# Altium footprint library Semiconductor.PcbLib: 73 footprints (part 3 of 5)
Each footprint in its own frame and in the unit in brackets; x right, y up, seen from the top. Pads: shape width x height; smd on the part's side, far side on the other; paste and mask are expansions set on the pad; w line width, h text height; cw(c..) or ccw(c..) is an arc to the next point about the centre after c.
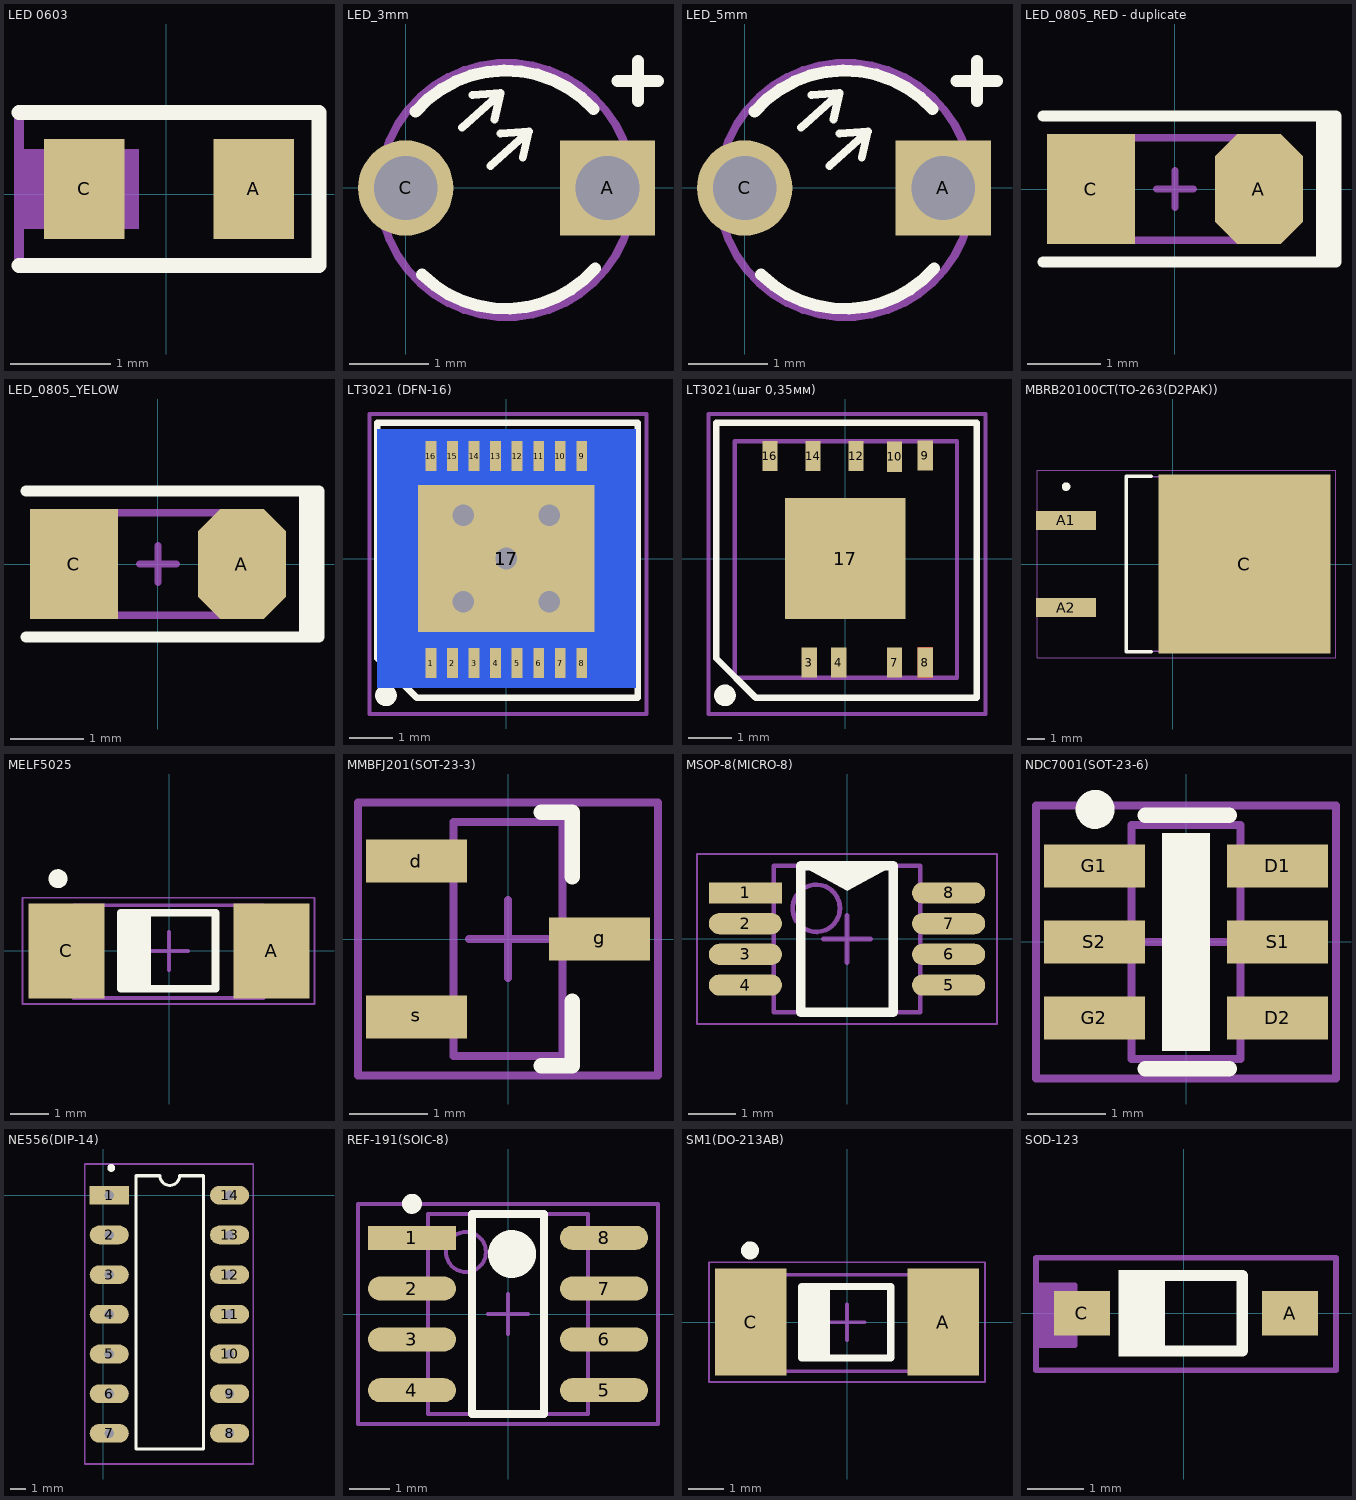
[diagram p2: the footprints below, top view; thin cyan lines are the x and y axes]

## LED 0603 [mm] "LED 0603"
height 0.5
pads (2):
  rect 0.8x1 smd: A(0.872,0.051) C(-0.821,0.051)
Top Overlay:
  lines w0.15: -1.473,-0.711 1.524,-0.711 1.524,0.813 -1.473,0.813
Mechanical 29:
  rectangle: -1.473,-0.349 -0.273,0.451
  lines w0.1: -1.473,-0.711 1.524,-0.711 1.524,0.813 -1.473,0.813 -1.473,-0.711
  text ".Designator" at -0.914,-0.127 h1
3D body: height 0.6, standoff 0, extent -0.81,-0.343 0.81,0.457

## LED_3mm [mm]
pads (2):
  rect 1.2x1.2 hole 0.8: A(2.54,0)
  round 1.2 hole 0.8: C(0,0)
Top Overlay:
  lines w0.1: 0.711,0.762 1.194,1.194 ; 1.067,0.279 1.549,0.711 ; 1.118,0.864 1.194,1.194 ; 1.473,0.381 1.549,0.711 ; 1.194,1.194 0.838,1.168 1.194,1.194 ; 1.549,0.711 1.194,0.686 1.549,0.711
  lines w0.15: 0.125,0.962 cw(c1.258,-0.02) 2.365,0.991 ; 0.206,-1.089 ccw(c1.258,-0.02) 2.386,-1.009 ; 2.667,1.346 3.175,1.346 ; 2.921,1.092 2.921,1.6
Mechanical 15:
  circle w0.1: c1.27,-0.025 r1.6
3D body: height 5.51, standoff -2.49, extent -0.404,-1.626 2.896,1.663

## LED_5mm [mm]
pads (2):
  rect 1.2x1.2 hole 0.8: A(2.5,0)
  round 1.2 hole 0.8: C(0,0)
Top Overlay:
  lines w0.1: 0.711,0.762 1.194,1.194 ; 1.067,0.279 1.549,0.711 ; 1.118,0.864 1.194,1.194 ; 1.473,0.381 1.549,0.711 ; 1.194,1.194 0.838,1.168 1.194,1.194 ; 1.549,0.711 1.194,0.686 1.549,0.711
  lines w0.15: 0.125,0.962 cw(c1.258,-0.02) 2.365,0.991 ; 0.206,-1.089 ccw(c1.258,-0.02) 2.386,-1.009 ; 2.667,1.346 3.175,1.346 ; 2.921,1.092 2.921,1.6
Mechanical 15:
  circle w0.1: c1.27,-0.025 r1.6
3D body: height 12.6, standoff -3, extent -1.65,-2.9 4.25,3

## LED_0805_RED - duplicate [mm] "Chip Resistor, 2-Leads, Body 2,0x1,3mm, IPC Medium Density"
height 0.5
pads (2):
  oct 1.2x1.5 smd: A(1.148,0)
  rect 1.2x1.5 smd: C(-1.148,0)
Top Overlay:
  lines w0.15: -1.8,-1 2.2,-1 2.2,1 -1.8,1 ; 2,-1 2,1 ; 2.1,-1 2.1,1
Mechanical 13:
  lines w0.1: -1.05,-0.7 -1.05,0.7 1.05,0.7 1.05,-0.7 -1.05,-0.7
Mechanical 15:
  lines w0.1: -0.25,0 0.25,0 ; 0,-0.25 0,0.25
3D body: height 1.1, standoff 0, extent -1.045,-0.62 0.975,0.63

## LED_0805_YELOW [mm] "Chip Resistor, 2-Leads, Body 2,0x1,3mm, IPC Medium Density"
height 0.5
pads (2):
  oct 1.2x1.5 smd: A(1.148,0)
  rect 1.2x1.5 smd: C(-1.148,0)
Top Overlay:
  lines w0.15: -1.8,-1 2.2,-1 2.2,1 -1.8,1 ; 2,-1 2,1 ; 2.1,-1 2.1,1
Mechanical 13:
  lines w0.1: -1.05,-0.7 -1.05,0.7 1.05,0.7 1.05,-0.7 -1.05,-0.7
Mechanical 15:
  lines w0.1: -0.25,0 0.25,0 ; 0,-0.25 0,0.25
3D body: height 1.1, standoff 0, extent -1.045,-0.62 0.975,0.63

## LT3021 (DFN-16) [mm] "QFN, 16-Leads, Body 5,1x5,1mm (max), Pitch 0,50mm, IPC Medium Density"
height 0.8
pads (18):
  rect 0.25x0.7 smd: 1(-1.75,-2.425) 2(-1.25,-2.425) 3(-0.75,-2.425) 4(-0.25,-2.425) 5(0.25,-2.425) 6(0.75,-2.425) 7(1.25,-2.425) 8(1.75,-2.425) 9(1.75,2.375) 10(1.25,2.375) 11(0.75,2.375) 12(0.25,2.375) 13(-0.25,2.375) 14(-0.75,2.375) 15(-1.25,2.375) 16(-1.75,2.375)
  rect 4.1x3.4 smd: 17(0,0)
  rect 6x6 smd far side: 17(0,0)
via -1,1 diameter 0.9 hole 0.5
via 1,1 diameter 0.9 hole 0.5
via -1,-1 diameter 0.9 hole 0.5
via 1,-1 diameter 0.9 hole 0.5
via 0,0 diameter 0.9 hole 0.5
Top Overlay:
  circle w0.25: c-2.792,-3.175 r0.125
  lines w0.15: -2.997,-2.311 -2.083,-3.226 3.048,-3.226 3.048,3.15 -2.997,3.15 -2.997,-2.311
Mechanical 13:
  lines w0.1: -2.565,-2.769 -2.565,2.718 2.591,2.718 2.591,-2.769 -2.565,-2.769
Mechanical 15:
  lines w0.1: -3.175,-3.607 -3.175,3.353 3.251,3.353 3.251,-3.607 -3.175,-3.607
3D body: height 0.75, standoff -0.05, extent -2.565,-2.769 2.535,2.731

## LT3021(шаг 0,35мм) [mm] "QFN, 16-Leads, Body 5,1x5,1mm (max), Pitch 0,50mm, IPC Medium Density"
height 0.8
pads (10):
  rect 0.35x0.7 smd: 3(-0.838,-2.413) 4(-0.152,-2.413) 7(1.143,-2.413) 8(1.854,-2.413) 9(1.854,2.388) 10(1.143,2.362) 12(0.25,2.375) 14(-0.75,2.375) 16(-1.75,2.375)
  rect 2.8x2.8 smd: 17(0,0)
Top Layer:
  rectangle: 1.676,-2.769 2.032,-2.057
Top Overlay:
  circle w0.25: c-2.792,-3.175 r0.125
  lines w0.15: -2.997,-2.311 -2.083,-3.226 3.048,-3.226 3.048,3.15 -2.997,3.15 -2.997,-2.311
Top Solder:
  rectangle: 0.864,1.905 2.134,2.845
  rectangle: 1.397,-2.87 1.6,-1.956
  rectangle: -0.584,-2.87 -0.406,-1.956
Mechanical 13:
  lines w0.1: -2.565,-2.769 -2.565,2.718 2.591,2.718 2.591,-2.769 -2.565,-2.769
Mechanical 15:
  lines w0.1: -3.175,-3.607 -3.175,3.353 3.251,3.353 3.251,-3.607 -3.175,-3.607
3D body: height 0.75, standoff -0.05, extent -2.565,-2.769 2.535,2.731

## MBRB20100CT(TO-263(D2PAK)) [mm] "D2-PAK, 6-Pads, Body 7,42x8,44mm (max), IPC Medium Density"
height 4.65
pads (3):
  rect 3.5x1.1 smd: A1(-6.2,2.54) A2(-6.2,-2.54)
  rect 10x10.4 smd: C(4.17,0)
Top Overlay:
  circle w0.25: c-6.2,4.5 r0.125
  lines w0.2: -1.25,-5.1 -2.7,-5.1 -2.7,5.1 -1.25,5.1
Mechanical 13:
  lines w0.1: -2.7,-5.075 5.94,-5.075 5.94,5.075 -2.7,5.075 -2.7,-5.075
Mechanical 15:
  lines w0.05: -7.875,-5.45 9.5,-5.45 9.5,5.45 -7.875,5.45 -7.875,-5.45
  lines w0.1: -0.5,0 0.5,0 ; 0,-0.5 0,0.5
3D body: height 4.88, standoff 0.08, extent -7.53,-5 8.14,5

## MELF5025 [mm]
pads (2):
  rect 2x2.5 smd: A(2.7,0) C(-2.7,0)
Top Overlay:
  circle w0.25: c-2.925,1.9 r0.125
  rectangle: -1.275,-1 -0.475,1
  lines w0.2: -1.275,-1 1.225,-1 1.225,1 -1.275,1 -1.275,-1
Mechanical 13:
  lines w0.1: -2.515,-1.245 -2.515,1.2 2.489,1.2 2.489,-1.245 -2.515,-1.245
Mechanical 15:
  lines w0.05: -3.861,-1.4 3.835,-1.4 3.835,1.4 -3.861,1.4 -3.861,-1.4
  lines w0.1: -0.5,0 0.5,0 ; 0,-0.5 0,0.5
3D body: height 2.55, standoff 0.05, extent -2.5,-1.25 2.5,1.25

## MMBFJ201(SOT-23-3) [mm] "SOT23, 3-Leads, Body 3,0x2,6mm (max), Pitch 0,95mm, IPC Medium Density"
height 1.1
pads (3):
  rect 1.3x0.55 smd: d(-1.175,1.001) g(1.175,0) s(-1.175,-1.001)
Top Overlay:
  lines w0.2: 0.425,-1.625 0.825,-1.625 0.825,-0.8 ; 0.425,1.625 0.825,1.625 0.825,0.8
Mechanical 13:
  lines w0.1: -0.7,-1.5 0.7,-1.5 0.7,1.5 -0.7,1.5 -0.7,-1.5
Mechanical 15:
  lines w0.1: -0.5,0 0.5,0 ; 0,-0.5 0,0.5 ; -1.925,-1.75 1.925,-1.75 1.925,1.75 -1.925,1.75 -1.925,-1.75
3D body: height 1.1, standoff 0, extent -1.271,-1.5 1.271,1.5

## MSOP-8(MICRO-8) [mm] "TSOP, 8-Leads, Body 3,00x3,00mm, Pitch 0,65mm, IPC Medium Density"
height 1.11
pads (8):
  rect 1.55x0.45 smd: 1(-2.15,0.975)
  oval 1.55x0.45 smd: 2(-2.15,0.325) 3(-2.15,-0.325) 4(-2.15,-0.975) 5(2.15,-0.975) 6(2.15,-0.325) 7(2.15,0.325) 8(2.15,0.975)
Top Overlay:
  region: -0.965,1.55 0.975,1.55 0,1.016
  lines w0.2: -0.975,-1.55 0.975,-1.55 0.975,1.55 -0.975,1.55 -0.975,-1.55
Mechanical 13:
  circle w0.1: c-0.65,0.65 r0.5
  lines w0.1: -1.55,-1.55 1.55,-1.55 1.55,1.55 -1.55,1.55 -1.55,-1.55
Mechanical 15:
  lines w0.05: -3.175,-1.8 3.175,-1.8 3.175,1.8 -3.175,1.8 -3.175,-1.8
  lines w0.1: -0.5,0 0.5,0 ; 0,-0.5 0,0.5
3D body: height 0.92, standoff 0, extent -2.5,-1.5 2.5,1.5

## NDC7001(SOT-23-6) [mm]
height 1.1
pads (6):
  rect 1.3x0.55 smd: D1(1.175,0.975) D2(1.175,-0.975) G1(-1.175,0.975) G2(-1.175,-0.975) S1(1.175,0) S2(-1.175,0)
Top Overlay:
  circle w0.25: c-1.166,1.702 r0.125
  rectangle: -0.305,-1.397 0.305,1.397
  lines w0.2: -0.524,-1.625 0.555,-1.625 ; -0.524,1.625 0.555,1.625
Mechanical 13:
  lines w0.1: -0.7,-1.5 -0.7,1.5 0.7,1.5 0.7,-1.5 -0.7,-1.5
Mechanical 15:
  lines w0.1: -0.5,0 0.5,0 ; 0,-0.5 0,0.5 ; -1.925,-1.75 -1.925,1.75 1.925,1.75 1.925,-1.75 -1.925,-1.75
3D body: height 1.09, standoff 0, extent -1.213,-1.4 1.213,1.394

## NE556(DIP-14) [mm]
pads (14):
  rect 2.5x1.2 hole 0.6: 1(0.375,0)
  oval 2.5x1.2 hole 0.6: 2(0.375,-2.54) 3(0.375,-5.08) 4(0.375,-7.62) 5(0.375,-10.16) 6(0.375,-12.7) 7(0.375,-15.24) 8(8.075,-15.24) 9(8.075,-12.7) 10(8.075,-10.16) 11(8.075,-7.62) 12(8.075,-5.08) 13(8.075,-2.54) 14(8.075,0)
Top Overlay:
  circle w0.25: c0.5,1.75 r0.125
  lines w0.2: 2.085,-16.25 2.085,1.25 3.625,1.25 ccw(c4.25,1.25) 4.875,1.25 6.415,1.25 6.415,-16.25 2.085,-16.25
Mechanical 15:
  lines w0.1: -1.2,-17.2 9.6,-17.2 9.6,2 -1.2,2 -1.2,-17.2
3D body: height 3.81, standoff -3.17, extent 0.25,-17.125 8.25,1.925

## REF-191(SOIC-8) [mm] "SOIC, 8-Leads, Body 5,0x4,0mm (max), Pitch 1,27mm, IPC Medium Density"
height 1.75
pads (8):
  rect 2.2x0.6 smd: 1(-2.4,1.905)
  oval 2.2x0.6 smd: 2(-2.4,0.635) 3(-2.4,-0.635) 4(-2.4,-1.905) 5(2.4,-1.905) 6(2.4,-0.635) 7(2.4,0.635) 8(2.4,1.905)
Top Overlay:
  circle w0.6: c0.1,1.5 r0.3
  circle w0.25: c-2.4,2.755 r0.125
  lines w0.2: -0.9,-2.5 0.9,-2.5 0.9,2.5 -0.9,2.5 -0.9,-2.5
Mechanical 13:
  circle w0.1: c-1.05,1.55 r0.5
  lines w0.1: -2,-2.5 2,-2.5 2,2.5 -2,2.5 -2,-2.5
Mechanical 15:
  lines w0.1: -0.5,0 0.5,0 ; 0,-0.5 0,0.5 ; -3.75,-2.75 3.75,-2.75 3.75,2.75 -3.75,2.75 -3.75,-2.75
3D body: height 1.75, standoff 0, extent -3.051,-2.436 2.949,2.464

## SM1(DO-213AB) [mm]
pads (2):
  rect 2x3 smd: A(2.7,0) C(-2.7,0)
Top Overlay:
  circle w0.25: c-2.716,2.007 r0.125
  rectangle: -1.275,-1 -0.475,1
  lines w0.2: -1.275,-1 1.225,-1 1.225,1 -1.275,1 -1.275,-1
Mechanical 13:
  lines w0.1: -2.616,-1.372 -2.616,1.321 2.591,1.321 2.591,-1.372 -2.616,-1.372
Mechanical 15:
  lines w0.05: -3.861,-1.676 3.861,-1.676 3.861,1.676 -3.861,1.676 -3.861,-1.676
  lines w0.1: -0.5,0 0.5,0 ; 0,-0.5 0,0.5
3D body: height 2.64, standoff -0.04, extent -2.609,-1.36 2.591,1.31

## SOD-123 [mm] "SOIC, 2-Leads, Body 2,60x1,60mm, Pitch 1,27mm, IPC Medium Density"
height 1.2
pads (2):
  rect 1x0.8 smd: A(1.897,0) C(-1.823,0)
Top Overlay:
  rectangle: -1.167,-0.774 -1.065,-0.571
  rectangle: -1.165,0.571 -1.063,0.774
  rectangle: -1.067,-0.675 -0.339,0.675
  lines w0.2: -1.067,-0.675 -1.067,0.675 1.041,0.675 1.041,-0.675 -1.067,-0.675
Mechanical 29:
  rectangle: -2.642,-0.571 -1.951,0.5
  lines w0.1: -2.642,-0.571 -1.951,-0.571 -1.951,0.5 -2.642,0.5 ; -2.642,-1.016 -2.642,0.991 2.718,0.991 2.718,-1.016 -2.642,-1.016
  text ".Designator" at -1.823,0 h1
3D body: height 1.42, standoff -0.03, extent -1.875,-0.85 1.975,0.85